# Altium footprint library My Library.PcbLib: 872 footprints (part 9 of 55)
Each footprint in its own frame and in the unit in brackets; x right, y up, seen from the top. Pads: shape width x height; smd on the part's side, far side on the other; paste and mask are expansions set on the pad; w line width, h text height; cw(c..) or ccw(c..) is an arc to the next point about the centre after c.
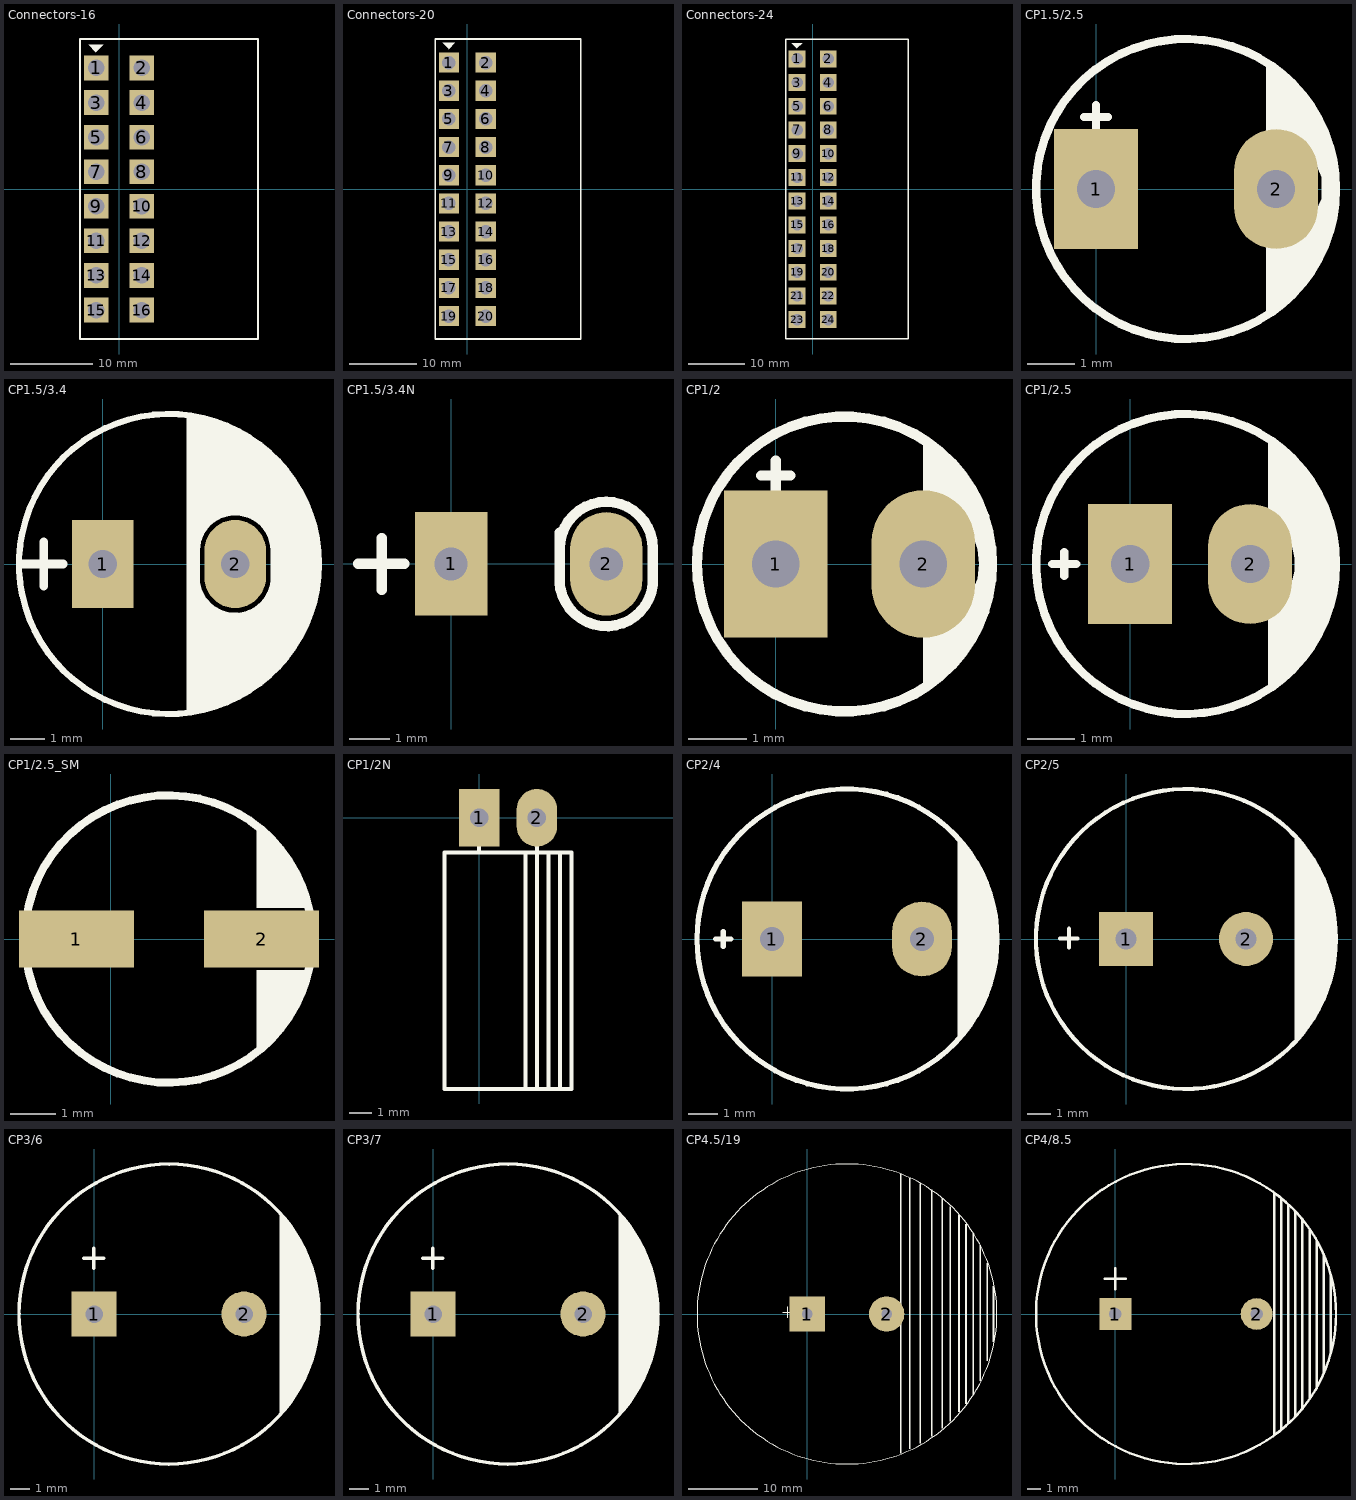
[diagram p8: the footprints below, top view; thin cyan lines are the x and y axes]

## Connectors-16 [mm]
pads (16):
  rect 3x3 hole 2: 1(-2.75,14.7) 2(2.75,14.7) 3(-2.75,10.5) 4(2.75,10.5) 5(-2.75,6.3) 6(2.75,6.3) 7(-2.75,2.1) 8(2.75,2.1) 9(-2.75,-2.1) 10(2.75,-2.1) 11(-2.75,-6.3) 12(2.75,-6.3) 13(-2.75,-10.5) 14(2.75,-10.5) 15(-2.75,-14.7) 16(2.75,-14.7)
Top Overlay:
  region: -1.892,17.513 -3.696,17.513 -2.807,16.624 -2.807,16.599
  lines w0.254: -4.759,-18.217 -4.759,18.217 16.9,18.217 16.9,-18.217 -4.759,-18.217
3D body: height 3.5, standoff 2.5, extent 2.032,13.894 4.75,15.418
3D body: height 10.2, standoff 0, extent 3.873,-17.827 17.027,17.827
3D body: height 7.7, standoff 6.7, extent -3.454,13.894 5.817,15.418
3D body: height 7.7, standoff -1, extent -3.454,13.894 -2.083,15.418
3D body: height 3.5, standoff 0, extent 2.057,13.894 3.454,15.418
3D body: height 3.5, standoff 0, extent 2.057,9.694 3.454,11.218
3D body: height 7.7, standoff -1, extent -3.454,9.694 -2.083,11.218
3D body: height 7.7, standoff 6.7, extent -3.454,9.694 5.817,11.218
3D body: height 3.5, standoff 2.5, extent 2.032,9.694 4.75,11.218
3D body: height 3.5, standoff 0, extent 2.057,5.494 3.454,7.018
3D body: height 7.7, standoff -1, extent -3.454,5.494 -2.083,7.018
3D body: height 7.7, standoff 6.7, extent -3.454,5.494 5.817,7.018
3D body: height 3.5, standoff 2.5, extent 2.032,5.494 4.75,7.018
3D body: height 3.5, standoff 0, extent 2.057,1.294 3.454,2.818
3D body: height 7.7, standoff -1, extent -3.454,1.294 -2.083,2.818
3D body: height 7.7, standoff 6.7, extent -3.454,1.294 5.817,2.818
3D body: height 3.5, standoff 2.5, extent 2.032,1.294 4.75,2.818
3D body: height 3.5, standoff 0, extent 2.057,-2.906 3.454,-1.382
3D body: height 7.7, standoff -1, extent -3.454,-2.906 -2.083,-1.382
3D body: height 7.7, standoff 6.7, extent -3.454,-2.906 5.817,-1.382
3D body: height 3.5, standoff 2.5, extent 2.032,-2.906 4.75,-1.382
3D body: height 3.5, standoff 0, extent 2.057,-7.106 3.454,-5.582
3D body: height 7.7, standoff -1, extent -3.454,-7.106 -2.083,-5.582
3D body: height 7.7, standoff 6.7, extent -3.454,-7.106 5.817,-5.582
3D body: height 3.5, standoff 2.5, extent 2.032,-7.106 4.75,-5.582
3D body: height 3.5, standoff 0, extent 2.057,-11.306 3.454,-9.782
3D body: height 7.7, standoff -1, extent -3.454,-11.306 -2.083,-9.782
3D body: height 7.7, standoff 6.7, extent -3.454,-11.306 5.817,-9.782
3D body: height 3.5, standoff 2.5, extent 2.032,-11.306 4.75,-9.782
3D body: height 3.5, standoff 0, extent 2.057,-15.506 3.454,-13.982
3D body: height 7.7, standoff -1, extent -3.454,-15.506 -2.083,-13.982
3D body: height 7.7, standoff 6.7, extent -3.454,-15.506 5.817,-13.982
3D body: height 3.5, standoff 2.5, extent 2.032,-15.506 4.75,-13.982
3D body: height 11.2, standoff 10.2, extent 13.801,-1.599 16.899,1.599

## Connectors-20 [mm]
pads (20):
  rect 3x3 hole 2: 1(-2.75,18.9) 2(2.75,18.9) 3(-2.75,14.7) 4(2.75,14.7) 5(-2.75,10.5) 6(2.75,10.5) 7(-2.75,6.3) 8(2.75,6.3) 9(-2.75,2.1) 10(2.75,2.1) 11(-2.75,-2.1) 12(2.75,-2.1) 13(-2.75,-6.3) 14(2.75,-6.3) 15(-2.75,-10.5) 16(2.75,-10.5) 17(-2.75,-14.7) 18(2.75,-14.7) 19(-2.75,-18.9) 20(2.75,-18.9)
Top Overlay:
  region: -1.848,21.831 -3.652,21.831 -2.763,20.942 -2.763,20.917
  lines w0.254: -4.759,-22.31 -4.759,22.417 16.9,22.417 16.9,-22.31 -4.759,-22.31
3D body: height 3.5, standoff 2.5, extent 2.032,18.094 4.75,19.618
3D body: height 7.7, standoff 6.7, extent -3.454,18.094 5.817,19.618
3D body: height 7.7, standoff -1, extent -3.454,18.094 -2.083,19.618
3D body: height 3.5, standoff 0, extent 2.057,18.094 3.454,19.618
3D body: height 3.5, standoff 0, extent 2.057,13.894 3.454,15.418
3D body: height 7.7, standoff -1, extent -3.454,13.894 -2.083,15.418
3D body: height 7.7, standoff 6.7, extent -3.454,13.894 5.817,15.418
3D body: height 3.5, standoff 2.5, extent 2.032,13.894 4.75,15.418
3D body: height 3.5, standoff 0, extent 2.057,9.694 3.454,11.218
3D body: height 7.7, standoff -1, extent -3.454,9.694 -2.083,11.218
3D body: height 7.7, standoff 6.7, extent -3.454,9.694 5.817,11.218
3D body: height 3.5, standoff 2.5, extent 2.032,9.694 4.75,11.218
3D body: height 3.5, standoff 0, extent 2.057,5.494 3.454,7.018
3D body: height 7.7, standoff -1, extent -3.454,5.494 -2.083,7.018
3D body: height 7.7, standoff 6.7, extent -3.454,5.494 5.817,7.018
3D body: height 3.5, standoff 2.5, extent 2.032,5.494 4.75,7.018
3D body: height 3.5, standoff 0, extent 2.057,1.294 3.454,2.818
3D body: height 7.7, standoff -1, extent -3.454,1.294 -2.083,2.818
3D body: height 7.7, standoff 6.7, extent -3.454,1.294 5.817,2.818
3D body: height 3.5, standoff 2.5, extent 2.032,1.294 4.75,2.818
3D body: height 3.5, standoff 0, extent 2.057,-2.906 3.454,-1.382
3D body: height 7.7, standoff -1, extent -3.454,-2.906 -2.083,-1.382
3D body: height 7.7, standoff 6.7, extent -3.454,-2.906 5.817,-1.382
3D body: height 3.5, standoff 2.5, extent 2.032,-2.906 4.75,-1.382
3D body: height 3.5, standoff 0, extent 2.057,-7.106 3.454,-5.582
3D body: height 7.7, standoff -1, extent -3.454,-7.106 -2.083,-5.582
3D body: height 7.7, standoff 6.7, extent -3.454,-7.106 5.817,-5.582
3D body: height 3.5, standoff 2.5, extent 2.032,-7.106 4.75,-5.582
3D body: height 11.2, standoff 10.2, extent 13.691,-1.481 16.79,1.718
3D body: height 3.5, standoff 2.5, extent 2.032,-19.706 4.75,-18.182
3D body: height 7.7, standoff 6.7, extent -3.454,-19.706 5.817,-18.182
3D body: height 7.7, standoff -1, extent -3.454,-19.706 -2.083,-18.182
3D body: height 3.5, standoff 0, extent 2.057,-19.706 3.454,-18.182
3D body: height 3.5, standoff 2.5, extent 2.032,-15.506 4.75,-13.982
3D body: height 7.7, standoff 6.7, extent -3.454,-15.506 5.817,-13.982
3D body: height 7.7, standoff -1, extent -3.454,-15.506 -2.083,-13.982
3D body: height 3.5, standoff 0, extent 2.057,-15.506 3.454,-13.982
3D body: height 3.5, standoff 0, extent 2.057,-11.306 3.454,-9.782
3D body: height 7.7, standoff -1, extent -3.454,-11.306 -2.083,-9.782
3D body: height 3.5, standoff 2.5, extent 2.032,-11.306 4.75,-9.782
3D body: height 3.5, standoff 2.5, extent 2.032,-11.306 4.75,-9.782
3D body: height 7.7, standoff 6.7, extent -3.454,-11.306 5.817,-9.782
3D body: height 7.7, standoff -1, extent -3.454,-11.306 -2.083,-9.782
3D body: height 3.5, standoff 0, extent 2.057,-11.306 3.454,-9.782
3D body: height 10.2, standoff 0, extent 3.81,-21.98 17.027,22.027

## Connectors-24 [mm]
pads (24):
  rect 3x3 hole 2: 1(-2.75,23.1) 2(2.75,23.1) 3(-2.75,18.9) 4(2.75,18.9) 5(-2.75,14.7) 6(2.75,14.7) 7(-2.75,10.5) 8(2.75,10.5) 9(-2.75,6.3) 10(2.75,6.3) 11(-2.75,2.1) 12(2.75,2.1) 13(-2.75,-2.1) 14(2.75,-2.1) 15(-2.75,-6.3) 16(2.75,-6.3) 17(-2.75,-10.5) 18(2.75,-10.5) 19(-2.75,-14.7) 20(2.75,-14.7) 21(-2.75,-18.9) 22(2.75,-18.9) 23(-2.75,-23.1) 24(2.75,-23.1)
Top Overlay:
  region: -1.892,25.895 -3.696,25.895 -2.807,25.006 -2.807,24.981
  lines w0.254: -4.759,-26.525 16.9,-26.525 16.9,26.617 -4.759,26.617 -4.759,-26.525
3D body: height 10.2, standoff 0, extent 3.81,-26.55 17.027,26.227
3D body: height 3.5, standoff 0, extent 2.057,-7.106 3.454,-5.582
3D body: height 7.7, standoff -1, extent -3.454,-7.106 -2.083,-5.582
3D body: height 7.7, standoff 6.7, extent -3.454,-7.106 5.817,-5.582
3D body: height 3.5, standoff 2.5, extent 2.032,-7.106 4.75,-5.582
3D body: height 3.5, standoff 2.5, extent 2.032,-7.106 4.75,-5.582
3D body: height 7.7, standoff -1, extent -3.454,-7.106 -2.083,-5.582
3D body: height 3.5, standoff 0, extent 2.057,-7.106 3.454,-5.582
3D body: height 3.5, standoff 0, extent 2.057,-11.306 3.454,-9.782
3D body: height 7.7, standoff -1, extent -3.454,-11.306 -2.083,-9.782
3D body: height 7.7, standoff 6.7, extent -3.454,-11.306 5.817,-9.782
3D body: height 3.5, standoff 2.5, extent 2.032,-11.306 4.75,-9.782
3D body: height 3.5, standoff 0, extent 2.057,-15.506 3.454,-13.982
3D body: height 7.7, standoff -1, extent -3.454,-15.506 -2.083,-13.982
3D body: height 7.7, standoff 6.7, extent -3.454,-15.506 5.817,-13.982
3D body: height 3.5, standoff 2.5, extent 2.032,-15.506 4.75,-13.982
3D body: height 3.5, standoff 0, extent 2.057,-19.706 3.454,-18.182
3D body: height 7.7, standoff -1, extent -3.454,-19.706 -2.083,-18.182
3D body: height 7.7, standoff 6.7, extent -3.454,-19.706 5.817,-18.182
3D body: height 3.5, standoff 2.5, extent 2.032,-19.706 4.75,-18.182
3D body: height 3.5, standoff 0, extent 2.057,-23.906 3.454,-22.382
3D body: height 7.7, standoff -1, extent -3.454,-23.906 -2.083,-22.382
3D body: height 7.7, standoff 6.7, extent -3.454,-23.906 5.817,-22.382
3D body: height 3.5, standoff 2.5, extent 2.032,-23.906 4.75,-22.382
3D body: height 11.2, standoff 10.2, extent 13.716,-1.861 16.815,1.338
3D body: height 3.5, standoff 2.5, extent 2.032,-2.906 4.75,-1.382
3D body: height 7.7, standoff 6.7, extent -3.454,-2.906 5.817,-1.382
3D body: height 7.7, standoff -1, extent -3.454,-2.906 -2.083,-1.382
3D body: height 3.5, standoff 0, extent 2.057,-2.906 3.454,-1.382
3D body: height 3.5, standoff 2.5, extent 2.032,1.294 4.75,2.818
3D body: height 7.7, standoff 6.7, extent -3.454,1.294 5.817,2.818
3D body: height 7.7, standoff -1, extent -3.454,1.294 -2.083,2.818
3D body: height 3.5, standoff 0, extent 2.057,1.294 3.454,2.818
3D body: height 3.5, standoff 2.5, extent 2.032,5.494 4.75,7.018
3D body: height 7.7, standoff 6.7, extent -3.454,5.494 5.817,7.018
3D body: height 7.7, standoff -1, extent -3.454,5.494 -2.083,7.018
3D body: height 3.5, standoff 0, extent 2.057,5.494 3.454,7.018
3D body: height 3.5, standoff 2.5, extent 2.032,9.694 4.75,11.218
3D body: height 7.7, standoff 6.7, extent -3.454,9.694 5.817,11.218
3D body: height 7.7, standoff -1, extent -3.454,9.694 -2.083,11.218
3D body: height 3.5, standoff 0, extent 2.057,9.694 3.454,11.218
3D body: height 3.5, standoff 2.5, extent 2.032,13.894 4.75,15.418
3D body: height 7.7, standoff 6.7, extent -3.454,13.894 5.817,15.418
3D body: height 7.7, standoff -1, extent -3.454,13.894 -2.083,15.418
3D body: height 3.5, standoff 0, extent 2.057,13.894 3.454,15.418
3D body: height 3.5, standoff 2.5, extent 2.032,18.094 4.75,19.618
3D body: height 7.7, standoff 6.7, extent -3.454,18.094 5.817,19.618
3D body: height 7.7, standoff -1, extent -3.454,18.094 -2.083,19.618
3D body: height 3.5, standoff 0, extent 2.057,18.094 3.454,19.618
3D body: height 3.5, standoff 0, extent 2.057,22.294 3.454,23.818
3D body: height 7.7, standoff -1, extent -3.454,22.294 -2.083,23.818
3D body: height 7.7, standoff 6.7, extent -3.454,22.294 5.817,23.818
3D body: height 3.5, standoff 2.5, extent 2.032,22.294 4.75,23.818

## CP1.5/2.5 [mil] "Tu hoa 33 >100 uF,50V, 220uF/16V,25V ( it su dung )"
height 300
pads (2):
  rect 70x100 hole 32: 1(0,0)
  oval 70x100 hole 32: 2(150,0)
Top Overlay:
  circle w7: c75,0 r125
  region: 142,106 142,39 156,39 173,35 182,25 188,10 188,-8 183,-19 183,-19.53 171,-33 155,-38 142,-41 142,-107 156,-96 177,-72 194,-40 199,-14 200,0 198,24 189,50 175,74 160,93
  lines w7: -10,60 10,60 ; 0,50 0,70
3D body "User Library-Cap 6_3x11.STEP": height 433.67, standoff -747.43, extent -46,-121.02 202.03,127.02

## CP1.5/3.4 [mil] "Tu hoa 220->470uF,16V, 470uF/16V,25V"
height 300
pads (2):
  rect 70x100 hole 32: 1(0,0)
  oval 70x100 hole 32: 2(150,0)
Top Overlay:
  circle w7: c75,0 r170
  region: 100,25 135,60 162.93,60 164.6,59.92 167.88,59.26 170.98,57.98 173.76,56.12 175,55 181.46,48.54 182.26,47.66 183.57,45.69 184.48,43.5 184.94,41.18 185,40 190,35 191.12,33.76 192.98,30.98 194.26,27.88 194.92,24.6 195,22.93 195,-27.93 194.92,-29.6 194.26,-32.88 192.98,-35.98 191.12,-38.76 190,-40 178.54,-51.46 177.66,-52.26 175.69,-53.57 173.5,-54.48 171.18,-54.94 170,-55 168.76,-56.12 165.98,-57.98 162.88,-59.26 159.6,-59.92 157.93,-60 144.14,-60 140.8,-59.84 134.23,-58.53 128.05,-55.97 122.48,-52.25 120,-50 108.54,-38.54 107.74,-37.66 106.43,-35.69 105.52,-33.5 105.06,-31.18 105,-30 100,-30 100,-170 155,-150 195,-120 225,-80 245,-20 245,20 230,70 200,115 165,145 120,165 100,170
  lines w10: -90,0 -45,0 ; -67,-25 -67,25 ; 100,-165 100,165 ; 100,25 105,25 ; 105,-20 105,30 ; 105,-10 ccw(c150,-15) 145,-60 ccw(c150,-15) 195,-20 195,15 ccw(c150,15) 150,60 ccw(c150,15) 105,15
3D body "User Library-CAP 8X11_5.STEP": height 445.89, standoff -754.41, extent -84.96,-157.48 230,157.48

## CP1.5/3.4N [mil] "Tu hoa 220->470uF,16V, 470uF/16V,25V"
height 300
pads (2):
  rect 70x100 hole 32: 1(0,0)
  oval 70x100 hole 32: 2(150,0)
Top Overlay:
  lines w10: -90,0 -45,0 ; -67,-25 -67,25 ; 105,-20 105,30 ; 105,-10 ccw(c150,-15) 145,-60 ccw(c150,-15) 195,-20 195,15 ccw(c150,15) 150,60 ccw(c150,15) 105,15
3D body: height 372.62, standoff 19.68, extent -96.82,-542.44 256.82,-70

## CP1/2 [mil] "Tu hoa < 22uF/16>50V"
height 300
pads (2):
  rect 70x100 hole 32: 1(0,0)
  oval 70x100 hole 32: 2(100,0)
Top Overlay:
  circle w7: c46.58,0 r100
  region: 100,84 100,38 112,36 122,32 129,27 134,19 137,10 138,0 137,-10 134,-17 129,-24 123,-31 117,-35 107,-38 100,-38 100,-85 108,-78 120,-69 128,-59 137,-44 144,-19 146,9 139,40 127,60 110,79
  lines w7: -10,60 10,60 ; 0,50 0,70
3D body "User Library-Cap electro 5x7x2mm.STEP": height 287.03, standoff -138.05, extent -49.42,-99.42 149.42,99.42

## CP1/2.5 [mil] "Tu hoa 33 >100 uF,50V, 220uF/16V,25V"
height 300
pads (2):
  rect 70x100 hole 32: 1(0,0)
  oval 70x100 hole 32: 2(100,0)
Top Overlay:
  circle w7: c46.58,0 r125
  region: 115,105 115,36 122,31 129,25 133,20 135,15 137,5 137,-6 135,-14 132,-19 128,-24 124,-28 120,-31 115,-34 115,-107 124,-99 139,-86 152,-69 167,-36 171,-15 171.58,0 167,30 153,67 131,93
  lines w7: -65,0 -45,0 ; -55,-10 -55,-5 -55,5 -55,10
3D body "User Library-Cap 6_3x11.STEP": height 421.54, standoff -759.57, extent -76,-124.03 172.03,124

## CP1/2.5_SM [mil] "Tu hoa SMD 33 >100 uF,50V, 220uF/16V,25V"
height 100
pads (2):
  rect 100x50 smd: 1(-30,0) 2(131,0)
Top Overlay:
  circle w7: c50,0 r125
  region: 127,98 127,27 172,27 173,9 170,-26 169.75,-27 127,-27 127,-98 141,-86 156,-67 170,-38 175,-19 175,18 170,37 162,58 146,82
  lines w7: -65,0 -45,0 ; -55,-10 -55,-5 -55,5 -55,10

## CP1/2N [mil] "Tu hoa < 22uF/16>50V"
height 300
pads (2):
  rect 70x100 hole 32: 1(0,0)
  oval 70x100 hole 32: 2(100,0)
Top Overlay:
  lines w7: 0,-60 0,-45 ; 80,-470 80,-60 ; 100,-470 100,-60 100,-45 ; 120,-470 120,-60 ; 140,-470 140,-60 ; -60,-470 160,-470 160,-60 -60,-60 -60,-470
3D body "User Library-Cap electro 5x7x2mm RA.STEP": height 199.43, standoff -136.22, extent -54.42,-351.27 144.43,15.7

## CP2/4 [mil] "Tu hoa 1000uF/16V/25V"
height 400
pads (2):
  rect 80x100 hole 32: 1(0,0)
  oval 80x100 hole 32: 2(200,0)
Top Overlay:
  circle w7: c100,0 r200
  region: 248,133 248,-134 262,-117 274,-97 284,-81 293,-55 299,-21 298,21 296,46 281,85 258,122
  lines w7: -75,0 -55,0 ; -65,-10 -65,10

## CP2/5 [mil] "Tu hoa 1000uF/25V,50V"
height 600
pads (2):
  rect 90x90 hole 35: 1(0,0)
  round 90 hole 35: 2(200,0)
Top Overlay:
  circle w7: c100,0 r250
  region: 281,174 281,-175 300,-149 301,-151 318,-124 334,-90 349,-29 350,0 348,34 341,70 321,116
  lines w7: -110,1 -81,1 ; -95,-14 -95,17
3D body "User Library-Cap12_5x25.STEP": height 984.37, standoff -747.43, extent -141.06,-247.12 351.06,245

## CP3/6 [mil] "Tu hoa 4700uF/25V"
height 600
pads (2):
  rect 90x90 hole 35: 1(0,0)
  round 90 hole 35: 2(300,0)
Top Overlay:
  circle w7: c150,0 r300
  region: 425,112 433,96 442,79 447,39 450,-9 449,-34 442,-69 429,-115 397,-171 382,-191 371,-203 371,200 384.5,182.5 395,168 408,153
  lines w7: -21,112 19,112 ; -1,92 -1,132
3D body: height 1220.47, standoff 39.37, extent -143.95,-295.69 444.28,293.7

## CP3/7 [mil] "Tu hoa 4700uF/25V"
height 600
pads (2):
  rect 90x90 hole 35: 1(0,0)
  round 90 hole 35: 2(300,0)
Top Overlay:
  circle w7: c150,0 r300
  region: 425,112 433,96 442,79 447,39 450,-9 449,-34 442,-69 429,-115 397,-171 382,-191 371,-203 371,200 384.5,182.5 395,168 408,153
  lines w7: -21,112 19,112 ; -1,92 -1,132

## CP4.5/19 [mil] "Tu hoa 10,000uF/63V"
height 600
pads (2):
  rect 200x200 hole 60: 1(0,0)
  round 200 hole 60: 2(450,0)
Top Overlay:
  circle w7: c225,0 r850
  rectangle: 975,-380 985,390
  rectangle: 935,-455 945,455
  rectangle: 895,-510 905,510
  rectangle: 855,-555 865,560
  rectangle: 805,-610 815,610
  rectangle: 760,-650 770,655
  rectangle: 1015,-265 1025,290
  rectangle: 1050,-160 1060,160
  rectangle: 700,-695 710,705
  rectangle: 635,-735 645,740
  rectangle: 575,-765 585,770
  rectangle: 525,-790 535,795
  lines w7: -140,10 -80,10 ; -110,-20 -110,40

## CP4/8.5 [mil] "Tu hoa 4700uF/50V"
height 600
pads (2):
  rect 90x90 hole 35: 1(0,0)
  round 90 hole 35: 2(400,0)
Top Overlay:
  circle w7: c200,0 r425
  lines w7: -30,100 30,100 ; 0,70 0,130 ; 450,-340 450,340 ; 470,-325 470,325 ; 490,-310 490,310 ; 510,-290 510,290 ; 530,-265 530,265 ; 550,-240 550,240 ; 570,-210 570,205 ; 590,-165 590,170
  lines w8: 610,-110 610,110
3D body "User Library-ECEC2DP271BJ.STEP": height 984.25, standoff 0, extent -236.14,-438.07 630,428.07